# Altium footprint library Electronic Devices_LIB.PcbLib: 410 footprints (part 15 of 26)
Each footprint in its own frame and in the unit in brackets; x right, y up, seen from the top. Pads: shape width x height; smd on the part's side, far side on the other; paste and mask are expansions set on the pad; w line width, h text height; cw(c..) or ccw(c..) is an arc to the next point about the centre after c.
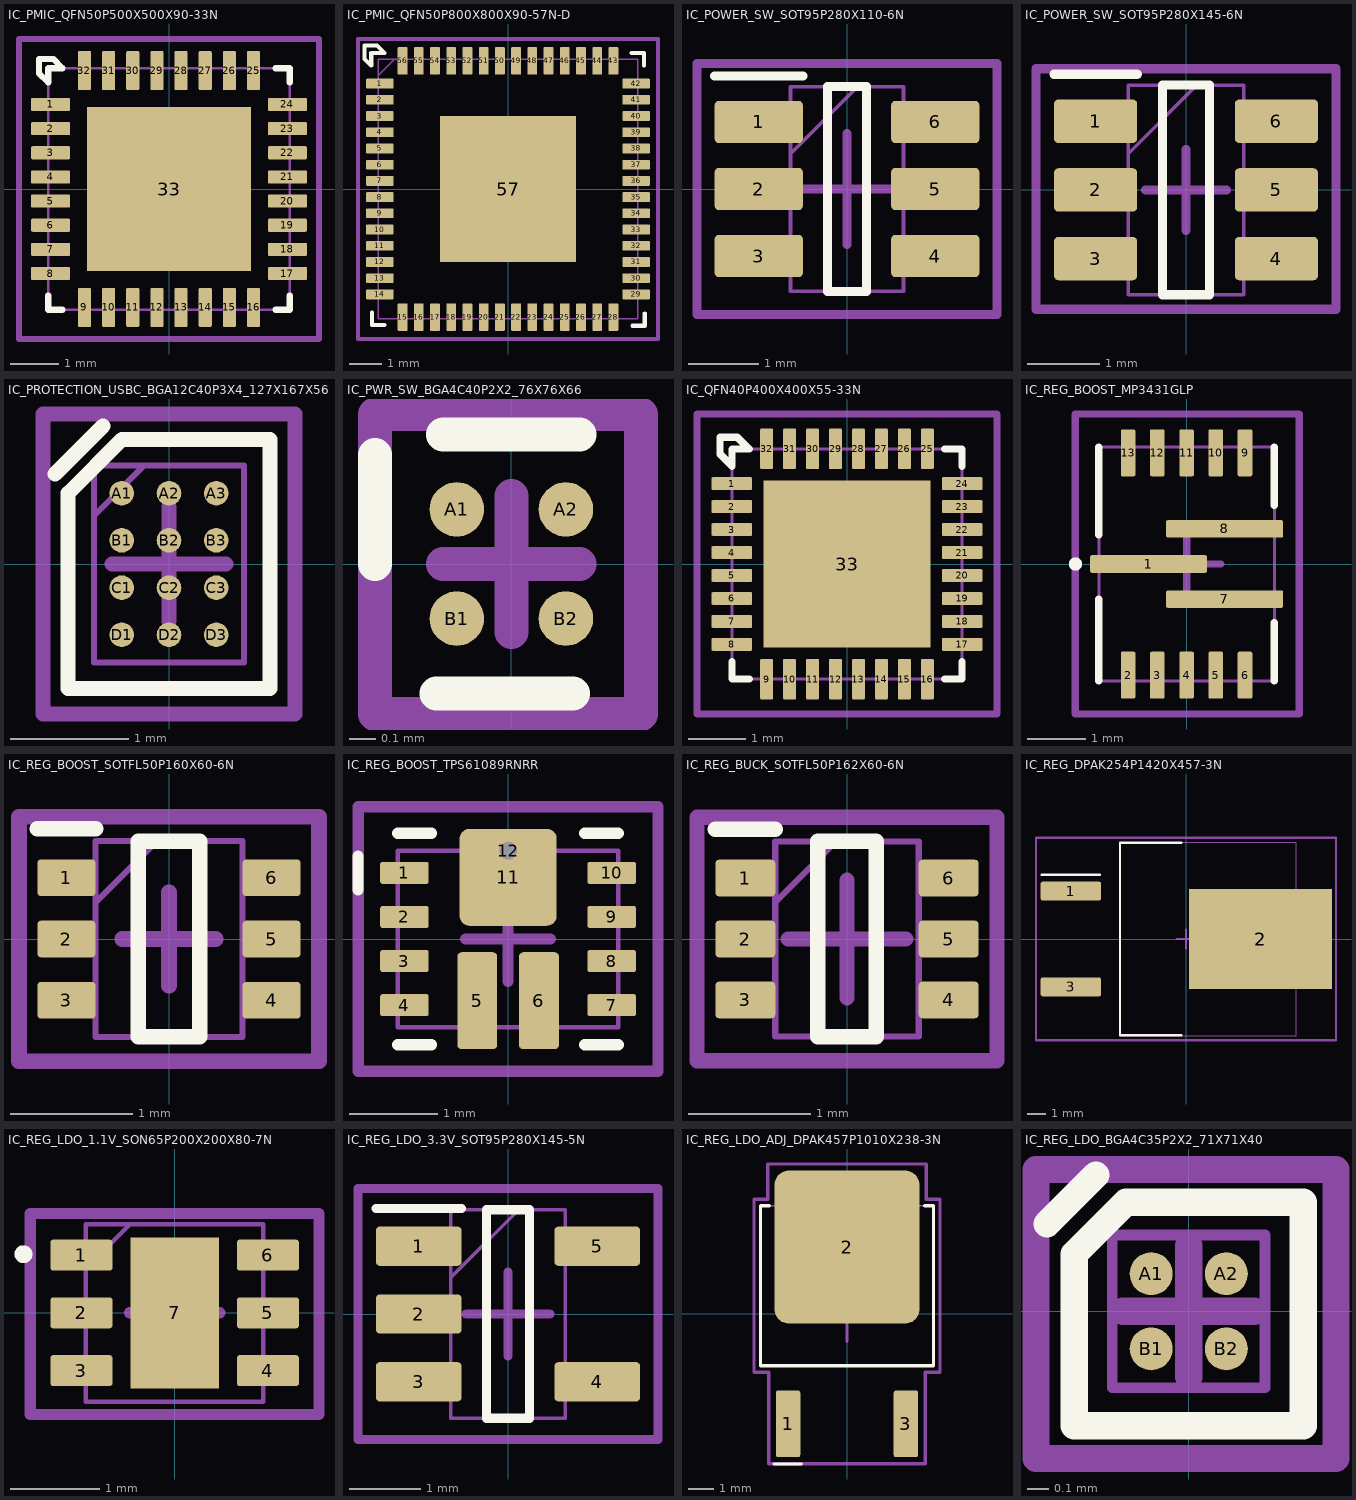
[diagram p14: the footprints below, top view; thin cyan lines are the x and y axes]

## IC_PMIC_QFN50P500X500X90-33N [mm]
pads (33):
  rrect20% 0.81x0.27 smd: 1(-2.45,1.75) 2(-2.45,1.25) 3(-2.45,0.75) 4(-2.45,0.25) 5(-2.45,-0.25) 6(-2.45,-0.75) 7(-2.45,-1.25) 8(-2.45,-1.75) 17(2.45,-1.75) 18(2.45,-1.25) 19(2.45,-0.75) 20(2.45,-0.25) 21(2.45,0.25) 22(2.45,0.75) 23(2.45,1.25) 24(2.45,1.75)
  rrect20% 0.27x0.81 smd: 9(-1.75,-2.45) 10(-1.25,-2.45) 11(-0.75,-2.45) 12(-0.25,-2.45) 13(0.25,-2.45) 14(0.75,-2.45) 15(1.25,-2.45) 16(1.75,-2.45) 25(1.75,2.45) 26(1.25,2.45) 27(0.75,2.45) 28(0.25,2.45) 29(-0.25,2.45) 30(-0.75,2.45) 31(-1.25,2.45) 32(-1.75,2.45)
  rect 3.4x3.4 smd paste-0.62: 33(0,0)
Top Overlay:
  lines w0.127: -2.5,-2.205 -2.5,-2.5 -2.205,-2.5 ; 2.205,-2.5 2.5,-2.5 2.5,-2.205 ; 2.205,2.5 2.5,2.5 2.5,2.205 ; -2.692,2.397 -2.692,2.692 -2.397,2.692 -2.205,2.5 -2.5,2.5 -2.5,2.205 -2.692,2.397
Top Assembly:
  lines w0.051: -2.5,-2.5 -2.5,2.5 2.5,2.5 2.5,-2.5 -2.5,-2.5
  text ".Designator" at -2.489,-0.136 h0.51
Top Courtyard:
  lines w0.127: -0.61,0 0,0 ; 0,-0.61 0,0 ; 0,0.61 0,0 ; 0.61,0 0,0 ; -3.105,-3.105 3.105,-3.105 3.105,3.105 -3.105,3.105 -3.105,-3.105
3D body "step_temp.STEP": height 0.9, standoff 0, extent -2.5,-2.5 2.5,2.5

## IC_PMIC_QFN50P800X800X90-57N-D [mm] "56-QFN-EP (8x8)"
height 0.9
pads (57):
  rrect20% 0.85x0.3 smd: 1(-3.95,3.25) 2(-3.95,2.75) 3(-3.95,2.25) 4(-3.95,1.75) 5(-3.95,1.25) 6(-3.95,0.75) 7(-3.95,0.25) 8(-3.95,-0.25) 9(-3.95,-0.75) 10(-3.95,-1.25) 11(-3.95,-1.75) 12(-3.95,-2.25) 13(-3.95,-2.75) 14(-3.95,-3.25) 29(3.95,-3.25) 30(3.95,-2.75) 31(3.95,-2.25) 32(3.95,-1.75) 33(3.95,-1.25) 34(3.95,-0.75) 35(3.95,-0.25) 36(3.95,0.25) 37(3.95,0.75) 38(3.95,1.25) 39(3.95,1.75) 40(3.95,2.25) 41(3.95,2.75) 42(3.95,3.25)
  rrect20% 0.3x0.85 smd: 15(-3.25,-3.95) 16(-2.75,-3.95) 17(-2.25,-3.95) 18(-1.75,-3.95) 19(-1.25,-3.95) 20(-0.75,-3.95) 21(-0.25,-3.95) 22(0.25,-3.95) 23(0.75,-3.95) 24(1.25,-3.95) 25(1.75,-3.95) 26(2.25,-3.95) 27(2.75,-3.95) 28(3.25,-3.95) 43(3.25,3.95) 44(2.75,3.95) 45(2.25,3.95) 46(1.75,3.95) 47(1.25,3.95) 48(0.75,3.95) 49(0.25,3.95) 50(-0.25,3.95) 51(-0.75,3.95) 52(-1.25,3.95) 53(-1.75,3.95) 54(-2.25,3.95) 55(-2.75,3.95) 56(-3.25,3.95)
  rect 4.2x4.5 smd: 57(0,0)
Top Overlay:
  lines w0.127: -4.191,-3.81 -4.191,-4.191 -3.81,-4.191 ; 3.81,4.191 4.191,4.191 4.191,3.81 ; 3.835,-4.216 4.216,-4.216 4.216,-3.835 ; -4.42,4.013 -4.42,4.42 -4.039,4.42 -3.81,4.191 -4.216,4.191 -4.216,3.81 -4.42,4.013
Top Assembly:
  lines w0.051: -4,3.5 -3.5,4 ; -4,-4 4,-4 4,4 -4,4 -4,-4
  text ".Designator" at -2.489,-0.059 h0.51
Top Courtyard:
  lines w0.127: -0.914,0 0,0 ; 0,-0.914 0,0 ; 0,0.914 0,0 ; 0.914,0 0,0 ; -4.625,-4.625 -4.625,4.625 4.625,4.625 4.625,-4.625 -4.625,-4.625
3D body "MC34PF4210A1ES.stp": height 0.9, standoff 0, extent -4.05,-4.05 4.05,4.05

## IC_POWER_SW_SOT95P280X110-6N [mm] "SOT-23-THIN"
height 1.1
pads (6):
  rrect20% 1.25x0.6 smd: 1(-1.25,0.95) 2(-1.25,0) 3(-1.25,-0.95) 4(1.25,-0.95) 5(1.25,0) 6(1.25,0.95)
Top Overlay:
  lines w0.127: -1.875,1.6 -0.625,1.6 ; -0.275,-1.45 0.275,-1.45 0.275,1.45 -0.275,1.45 -0.275,-1.45
Top Assembly:
  lines w0.051: -0.8,0.5 0.15,1.45 ; -0.8,-1.45 0.8,-1.45 0.8,1.45 -0.8,1.45 -0.8,-1.45
  text ".Designator" at -2.489,-0.212 h0.51
Top Courtyard:
  lines w0.127: -0.787,0 0,0 ; 0,-0.787 0,0 ; 0,0.787 0,0 ; 0.787,0 0,0 ; -2.125,-1.775 2.125,-1.775 2.125,1.775 -2.125,1.775 -2.125,-1.775
3D body "TPS562200DDCT.stp": height 0.97, standoff 0, extent -1.4,-1.45 1.4,1.45

## IC_POWER_SW_SOT95P280X145-6N [mm]
pads (6):
  rrect20% 1.15x0.6 smd: 1(-1.25,0.95) 2(-1.25,0) 3(-1.25,-0.95) 4(1.25,-0.95) 5(1.25,0) 6(1.25,0.95)
Top Overlay:
  lines w0.127: -1.825,1.6 -0.675,1.6 ; -0.325,-1.45 -0.325,1.45 0.325,1.45 0.325,-1.45 -0.325,-1.45
Top Assembly:
  lines w0.051: -0.8,0.5 0.15,1.45 ; -0.8,-1.45 -0.8,1.45 0.8,1.45 0.8,-1.45 -0.8,-1.45
  text ".Designator" at -2.667,-0.237 h0.51
Top Courtyard:
  lines w0.127: -0.559,0 0,0 ; 0,-0.559 0,0 ; 0,0.559 0,0 ; 0.559,0 0,0 ; -2.075,-1.651 -2.075,1.676 2.075,1.676 2.075,-1.651 -2.075,-1.651
3D body "AP22653AW6-7.stp": height 1.45, standoff 0, extent -1.4,-1.45 1.4,1.45

## IC_PROTECTION_USBC_BGA12C40P3X4_127X167X56 [mm]
pads (12):
  round 0.208 smd: A1(-0.4,0.6) A2(0,0.6) A3(0.4,0.6) B1(-0.4,0.2) B2(0,0.2) B3(0.4,0.2) C1(-0.4,-0.2) C2(0,-0.2) C3(0.4,-0.2) D1(-0.4,-0.6) D2(0,-0.6) D3(0.4,-0.6)
Top Overlay:
  lines w0.127: -0.965,0.762 -0.559,1.168 ; -0.854,-1.054 0.854,-1.054 0.854,1.054 -0.4,1.054 -0.854,0.6 -0.854,-1.054
Top Assembly:
  lines w0.051: -0.635,0.41 -0.21,0.835 ; -0.635,-0.835 0.635,-0.835 0.635,0.835 -0.635,0.835 -0.635,-0.835
  text ".Designator" at -2.438,-0.161 h0.51
Top Courtyard:
  lines w0.127: -0.483,0 0,0 ; 0,-0.483 0,0 ; 0,0.483 0,0 ; 0.483,0 0,0
Mechanical 15:
  lines w0.127: -1.067,-1.27 1.067,-1.27 1.067,1.27 -1.067,1.27 -1.067,-1.27
3D body "NX20P0407UKZ.stp": height 0.57, standoff 0, extent -0.635,-0.835 0.635,0.835

## IC_PWR_SW_BGA4C40P2X2_76X76X66 [mil] "4-WLCSP (0.76x0.76)"
height 23.62
pads (4):
  round 8 smd: A1(-8,8) A2(8,8) B1(-8,-8) B2(8,-8)
Top Overlay:
  lines w5: -20,0 -20,16 ; -11,-19 9,-19 ; -10,19 10,19
Top Assembly:
  text ".Designator" at -87,-6.34 h20
Top Courtyard:
  lines w5: -10,0 0,0 ; 0,-10 0,0 ; 0,10 0,0 ; 10,0 0,0 ; -20,-22 19,-22 19,22 -20,22 -20,-22
3D body "ADP191ACBZ-R7.stp": height 25.98, standoff 0, extent -15.75,-15.75 15.75,15.75

## IC_QFN40P400X400X55-33N [mm]
pads (33):
  rrect20% 0.71x0.22 smd: 1(-2.005,1.4) 2(-2.005,1) 3(-2.005,0.6) 4(-2.005,0.2) 5(-2.005,-0.2) 6(-2.005,-0.6) 7(-2.005,-1) 8(-2.005,-1.4) 17(2.005,-1.4) 18(2.005,-1) 19(2.005,-0.6) 20(2.005,-0.2) 21(2.005,0.2) 22(2.005,0.6) 23(2.005,1) 24(2.005,1.4)
  rrect20% 0.22x0.71 smd: 9(-1.4,-2.005) 10(-1,-2.005) 11(-0.6,-2.005) 12(-0.2,-2.005) 13(0.2,-2.005) 14(0.6,-2.005) 15(1,-2.005) 16(1.4,-2.005) 25(1.4,2.005) 26(1,2.005) 27(0.6,2.005) 28(0.2,2.005) 29(-0.2,2.005) 30(-0.6,2.005) 31(-1,2.005) 32(-1.4,2.005)
  rect 2.9x2.9 smd paste-2: 33(0,0)
Top Overlay:
  lines w0.127: -2,-1.7 -2,-2 -1.7,-2 ; 1.7,-2 2,-2 2,-1.7 ; 1.7,2 2,2 2,1.7 ; -2.21,1.907 -2.21,2.207 -1.91,2.207 -1.907,2.207 -1.7,2 -2,2 -2,1.7 -2.207,1.907 -2.21,1.907
Top Paste:
  region: 0.917,-0.919 -0.919,-0.919 -0.919,0.917 0.917,0.917
Top Assembly:
  lines w0.051: -2,-2 -2,2 2,2 2,-2 -2,-2
  text ".Designator" at -2.591,-0.186 h0.51
Top Courtyard:
  lines w0.127: -0.483,0 0,0 ; 0,-0.483 0,0 ; 0,0.483 0,0 ; 0.483,0 0,0 ; -2.61,-2.61 -2.61,2.61 2.61,2.61 2.61,-2.61 -2.61,-2.61
3D body "EFM8LB10F16E-B-QFN32R.STEP": height 0.56, standoff 0.01, extent -2,-2 2,2

## IC_REG_BOOST_MP3431GLP [mm] "QFN-13"
height 1
pads (13):
  rrect20% 2x0.3 smd: 1(-0.65,0) 7(0.65,-0.6) 8(0.65,0.6)
  rrect20% 0.25x0.8 smd: 2(-1,-1.9) 3(-0.5,-1.9) 4(0,-1.9) 5(0.5,-1.9) 6(1,-1.9) 9(1,1.9) 10(0.5,1.9) 11(0,1.9) 12(-0.5,1.9) 13(-1,1.9)
Top Overlay:
  lines w0.127: -1.5,-2 -1.5,-0.6 ; -1.5,0.5 -1.5,2 ; 1.5,-2 1.5,-1 ; 1.5,1 1.5,2 ; -1.9,-0.05 cw(c-1.9,0) -1.9,0.05 cw(c-1.9,0) -1.9,-0.05
Top Assembly:
  lines w0.051: -1.5,-2 -1.5,2 1.5,2 1.5,-2 -1.5,-2
  text ".Designator" at -2.515,-0.212 h0.51
Top Courtyard:
  lines w0.127: -0.584,0 0,0 ; 0,-0.584 0,0 ; 0,0.584 0,0 ; 0.584,0 0,0 ; -1.905,-2.565 -1.905,2.565 1.93,2.565 1.93,-2.565 -1.905,-2.565
3D body "MP3431GL-P.stp": height 1.1, standoff 0, extent -1.5,-2 1.5,2

## IC_REG_BOOST_SOTFL50P160X60-6N [mm] "SOT-563"
height 0.6
pads (6):
  rrect20% 0.475x0.3 smd: 1(-0.838,0.5) 2(-0.838,0) 3(-0.838,-0.5) 4(0.838,-0.5) 5(0.838,0) 6(0.838,0.5)
Top Overlay:
  lines w0.127: -1.075,0.9 -0.6,0.9 ; -0.25,-0.8 0.25,-0.8 0.25,0.8 -0.25,0.8 -0.25,-0.8
Top Assembly:
  lines w0.051: -0.6,0.3 -0.1,0.8 ; -0.6,-0.8 0.6,-0.8 0.6,0.8 -0.6,0.8 -0.6,-0.8
  text ".Designator" at -2.388,-0.136 h0.51
Top Courtyard:
  lines w0.127: -0.381,0 0,0 ; 0,-0.381 0,0 ; 0,0.381 0,0 ; 0.381,0 0,0 ; -1.225,-1 1.225,-1 1.225,1 -1.225,1 -1.225,-1
3D body "DRV8220DRLR.stp": height 0.6, standoff 0, extent -0.8,-0.8 0.8,0.8

## IC_REG_BOOST_TPS61089RNRR [mm] "11-VQFN-HR (2.5x2)"
height 1
pads (12):
  rrect20% 0.55x0.25 smd mask+0: 1(-1.175,0.75) 2(-1.175,0.25) 3(-1.175,-0.25) 4(-1.175,-0.75) 7(1.175,-0.75) 8(1.175,-0.25) 9(1.175,0.25) 10(1.175,0.75)
  rrect20% 0.45x1.1 smd paste-2 mask+0: 5(-0.35,-0.7) 6(0.35,-0.7)
  rrect20% 1.1x1.1 smd paste-2 mask+0: 11(0,0.7)
  rrect20% 0.3x0.3 hole 0.2 mask+0: 12(0,1)
Top Overlay:
  lines w0.127: -1.702,0.559 -1.702,0.94 ; -1.25,-1.2 -0.87,-1.2 ; -1.25,1.2 -0.87,1.2 ; 0.87,-1.2 1.25,-1.2 ; 0.87,1.2 1.25,1.2
Top Paste:
  drawing of 5 lines, arcs and shapes, not listed
Top Solder:
  drawing of 11 lines, arcs and shapes, not listed
Top Assembly:
  lines w0.051: -1.25,-1 -1.25,1 1.25,1 1.25,-1 -1.25,-1
Top Courtyard:
  lines w0.127: -0.483,0 0,0 ; 0,-0.483 0,0 ; 0,0.483 0,0 ; 0.483,0 0,0 ; -1.7,-1.5 1.7,-1.5 1.7,1.5 -1.7,1.5 -1.7,-1.5
3D body "step_temp.STEP": height 1, standoff 0, extent -1.25,-1 1.25,1

## IC_REG_BUCK_SOTFL50P162X60-6N [mm]
pads (6):
  rrect20% 0.492x0.3 smd: 1(-0.834,0.5) 2(-0.834,0) 3(-0.834,-0.5) 4(0.834,-0.5) 5(0.834,0) 6(0.834,0.5)
Top Overlay:
  lines w0.127: -1.08,0.9 -0.588,0.9 ; -0.238,-0.8 0.238,-0.8 0.238,0.8 -0.238,0.8 -0.238,-0.8
Top Assembly:
  lines w0.051: -0.588,0.3 -0.088,0.8 ; -0.588,-0.8 0.588,-0.8 0.588,0.8 -0.588,0.8 -0.588,-0.8
  text ".Designator" at -2.464,-0.11 h0.51
Top Courtyard:
  lines w0.127: -0.483,0 0,0 ; 0,-0.483 0,0 ; 0,0.483 0,0 ; 0.483,0 0,0 ; -1.23,-1 1.23,-1 1.23,1 -1.23,1 -1.23,-1
3D body "AP61102Z6-7.stp": height 0.6, standoff 0, extent -0.813,-0.8 0.813,0.8

## IC_REG_DPAK254P1420X457-3N [mm] "D2-PAK, 3-Pads, Body 7.77x8.48mm (max), IPC Medium Density"
height 4.58
pads (3):
  rrect20% 3.2x1 smd: 1(-6.1,2.54) 3(-6.1,-2.54)
  rect 7.6x5.3 smd: 2(3.95,0)
Top Overlay:
  lines w0.127: -7.645,3.404 -4.572,3.404 ; -0.25,-5.1 -3.5,-5.1 -3.5,5.1 -0.25,5.1
Top Assembly:
  lines w0.051: -3.5,-5.125 -3.5,5.125 5.85,5.125 5.85,-5.125 -3.5,-5.125
  text ".Designator" at -0.212,2.464 h0.51
Top Courtyard:
  lines w0.1: -0.5,0 0.5,0 ; 0,-0.5 0,0.5
  lines w0.127: -7.95,-5.375 -7.95,5.375 7.95,5.375 7.95,-5.375 -7.95,-5.375
3D body "IC_REG_DPAK254P1420X457-3N.step": height 5.23, standoff 0, extent -6.714,-5.125 7.485,5.125

## IC_REG_LDO_1.1V_SON65P200X200X80-7N [mm]
pads (7):
  rrect20% 0.7x0.35 smd: 1(-1.05,0.65) 2(-1.05,0) 3(-1.05,-0.65) 4(1.05,-0.65) 5(1.05,0) 6(1.05,0.65)
  rect 1x1.7 smd: 7(0,0)
Top Overlay:
  circle w0.1: c-1.702,0.66 r0.051
Top Assembly:
  lines w0.051: -1,0.5 -0.5,1 ; -1,-1 1,-1 1,1 -1,1 -1,-1
  text ".Designator" at -2.54,-0.11 h0.51
Top Courtyard:
  lines w0.127: -0.508,0 0,0 ; 0,-0.508 0,0 ; 0,0.508 0,0 ; 0.508,0 0,0 ; -1.625,-1.143 1.625,-1.143 1.625,1.118 -1.625,1.118 -1.625,-1.143
3D body "TPS74611PQWDRVRQ1.stp": height 0.77, standoff 0, extent -1,-1 1,1

## IC_REG_LDO_3.3V_SOT95P280X145-5N [mm]
pads (5):
  rrect20% 1.2x0.55 smd: 1(-1.25,0.95) 2(-1.25,0) 3(-1.25,-0.95) 4(1.25,-0.95) 5(1.25,0.95)
Top Overlay:
  lines w0.127: -1.85,1.475 -0.65,1.475 ; -0.3,-1.46 0.3,-1.46 0.3,1.46 -0.3,1.46 -0.3,-1.46
Top Assembly:
  lines w0.051: -0.8,0.51 0.15,1.46 ; -0.8,-1.46 -0.8,1.46 0.8,1.46 0.8,-1.46 -0.8,-1.46
  text ".Designator" at -2.718,-0.186 h0.51
Top Courtyard:
  lines w0.127: -0.584,0 0,0 ; 0,-0.584 0,0 ; 0,0.584 0,0 ; 0.584,0 0,0 ; -2.1,-1.76 2.1,-1.76 2.1,1.76 -2.1,1.76 -2.1,-1.76
3D body "AP2202K-3.3TRG1.stp": height 1.45, standoff 0, extent -1.4,-1.46 1.4,1.46

## IC_REG_LDO_ADJ_DPAK457P1010X238-3N [mm] "TO-252-3, DPAK (2 Leads + Tab), SC-63"
height 2.3
pads (3):
  rrect20% 0.95x2.59 smd: 1(-2.286,-4.26) 3(2.286,-4.26)
  rrect20% 5.63x5.94 smd: 2(0,2.59)
Top Overlay:
  lines w0.127: -3,4.19 -3.35,4.19 -3.35,-2.01 3.35,-2.01 3.35,4.19 3,4.19 ; -2.819,-5.817 -1.778,-5.817
Top Assembly:
  lines w0.051: -3.35,-2.01 -3.35,4.19 3.35,4.19 3.35,-2.01 -3.35,-2.01
  text ".Designator" at -2.642,1.134 h0.51
Top Courtyard:
  lines w0.127: -1.067,0 0,0 ; 0,-1.067 0,0 ; 0,1.067 0,0 ; 1.067,0 0,0 ; -3.6,-2.26 -3.03,-2.26 -3.03,-5.81 3.03,-5.81 3.03,-2.26 3.6,-2.26 3.6,4.44 3.07,4.44 3.07,5.81 -3.07,5.81 -3.07,4.44 -3.6,4.44 -3.6,-2.26
3D body "AZ1084CD-ADJTRG1.stp": height 2.39, standoff -0.13, extent -3.325,-4.76 3.375,4.64

## IC_REG_LDO_BGA4C35P2X2_71X71X40 [mm] "4-DSBGA"
height 0.4
pads (4):
  round 0.2 smd: A1(-0.175,0.175) A2(0.175,0.175) B1(-0.175,-0.175) B2(0.175,-0.175)
Top Overlay:
  lines w0.127: -0.66,0.406 -0.432,0.635 ; -0.533,-0.533 0.533,-0.533 0.533,0.508 -0.292,0.508 -0.533,0.267 -0.533,-0.533
Top Assembly:
  lines w0.051: -0.356,-0.356 0.356,-0.356 0.356,0.356 -0.356,0.356 -0.356,-0.356
  text ".Designator" at -2.718,-0.136 h0.51
Top Courtyard:
  lines w0.127: -0.305,0 0,0 ; 0,-0.305 0,0 ; 0,0.305 0,0 ; 0.305,0 0,0 ; -0.711,-0.686 0.686,-0.686 0.686,0.66 -0.711,0.66 -0.711,-0.686
3D body "LP5910-1.1YKAR.stp": height 0.4, standoff 0, extent -0.356,-0.356 0.356,0.356